# Altium footprint library Connectors.PcbLib: 92 footprints (part 5 of 6)
Each footprint in its own frame and in the unit in brackets; x right, y up, seen from the top. Pads: shape width x height; smd on the part's side, far side on the other; paste and mask are expansions set on the pad; w line width, h text height; cw(c..) or ccw(c..) is an arc to the next point about the centre after c.
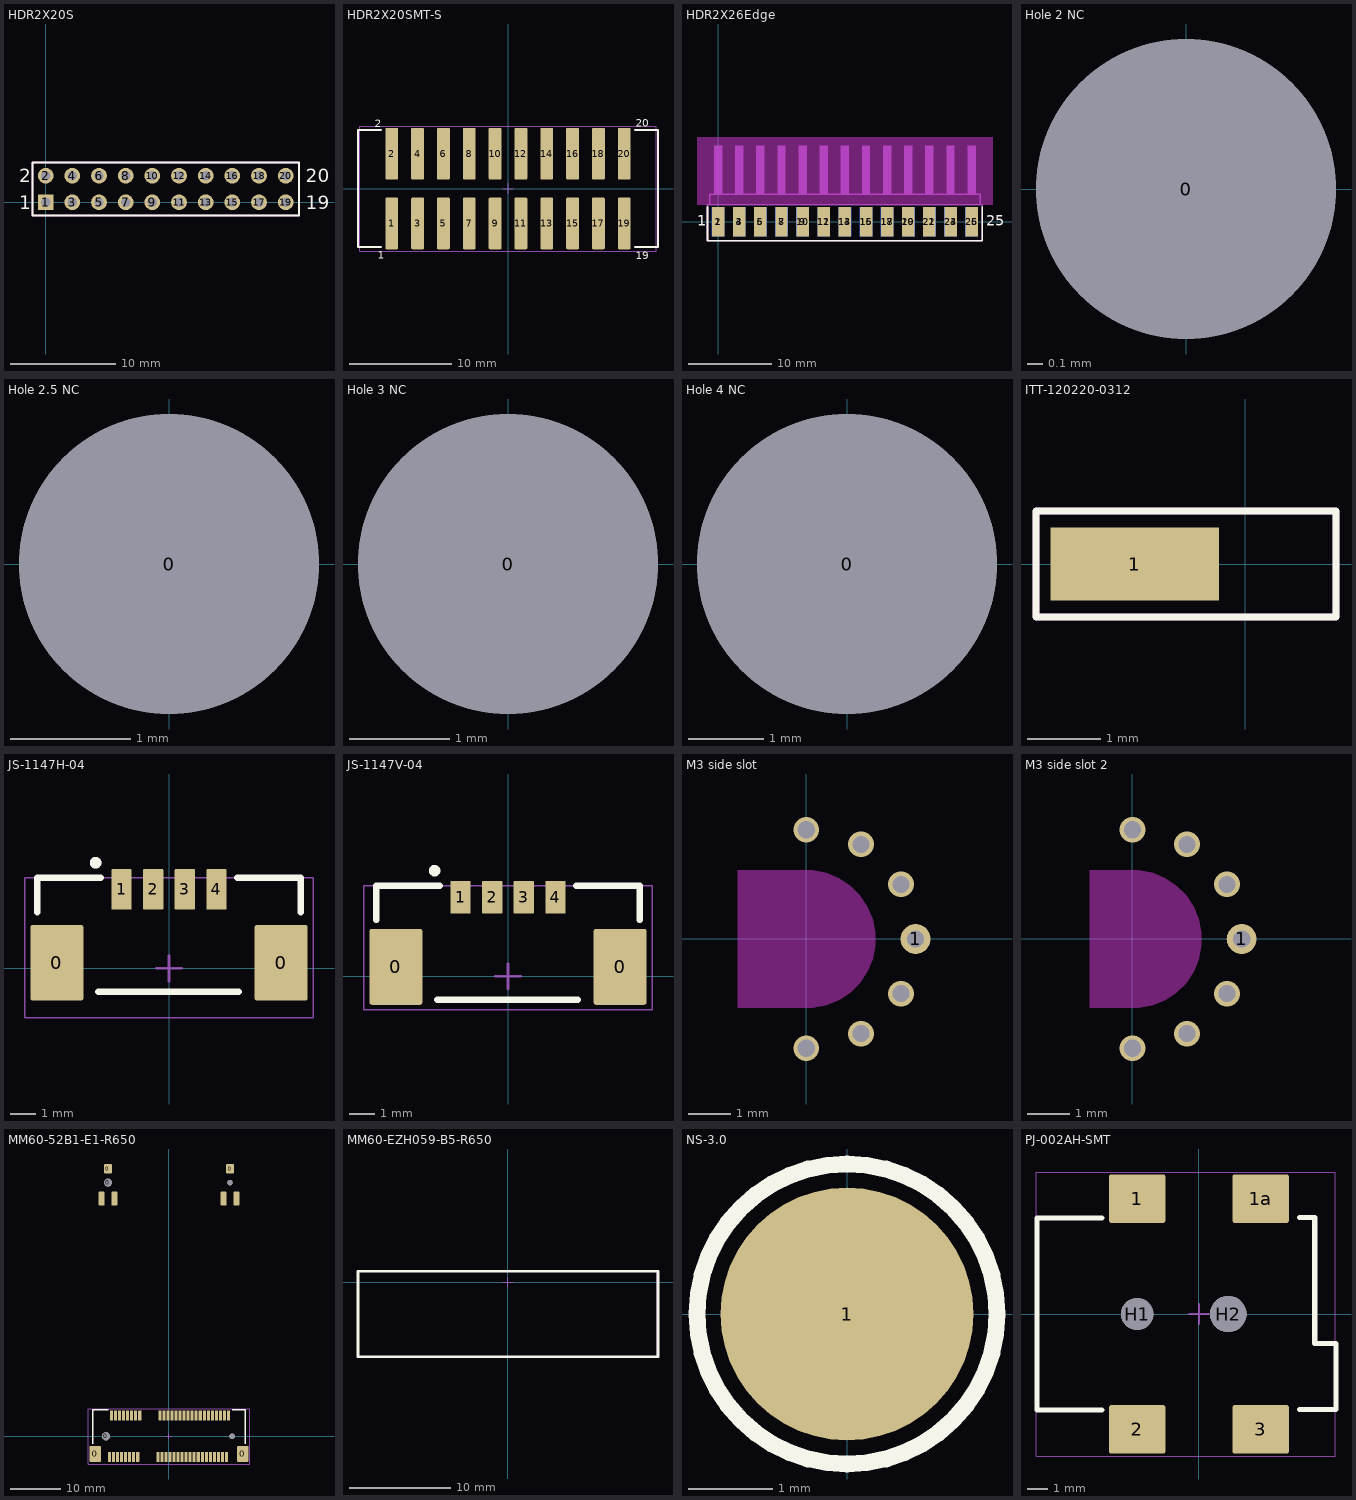
[diagram p4: the footprints below, top view; thin cyan lines are the x and y axes]

## HDR2X20S [mm] "Connector; Header; 10x2 Position"
pads (20):
  rect 1.5x1.5 hole 0.9: 1(0,0)
  round 1.5 hole 0.9: 2(0,2.54) 3(2.54,0) 4(2.54,2.54) 5(5.08,0) 6(5.08,2.54) 7(7.62,0) 8(7.62,2.54) 9(10.16,0) 10(10.16,2.54) 11(12.7,0) 12(12.7,2.54) 13(15.24,0) 14(15.24,2.54) 15(17.78,0) 16(17.78,2.54) 17(20.32,0) 18(20.32,2.54) 19(22.86,0) 20(22.86,2.54)
Top Overlay:
  lines w0.2: -1.27,-1.27 -1.27,3.81 24.13,3.81 24.13,-1.27 -1.27,-1.27
  text "2" at -2.54,1.905 h1.27
  text "1" at -2.54,-0.635 h1.27
  text "20" at 24.765,1.905 h1.27
  text "19" at 24.765,-0.635 h1.27
Mechanical 13:
  lines w0.2: -1.27,-1.27 24.13,-1.27 24.13,3.81 -1.27,3.81 -1.27,-1.27
  text ".Comment" at -0.975,-2.025 h0.51
  text ".Designator" at -1.125,4.19 h0.51

## HDR2X20SMT-S [mil] "Connector; Header; 10x2 Position, Shrouded SMT"
height 400
pads (20):
  rrect20% 50x200 smd: 1(-450,-135) 2(-450,135) 3(-350,-135) 4(-350,135) 5(-250,-135) 6(-250,135) 7(-150,-135) 8(-150,135) 9(-50,-135) 10(-50,135) 11(50,-135) 12(50,135) 13(150,-135) 14(150,135) 15(250,-135) 16(250,135) 17(350,-135) 18(350,135) 19(450,-135) 20(450,135)
Top Overlay:
  lines w7.87: -492.13,-226.38 -580.71,-226.38 -580.71,226.38 -492.13,226.38 ; 492.13,-226.38 580.71,-226.38 580.71,226.38 492.13,226.38
  text "2" at -515.75,238.19 h30
  text "1" at -503.94,-271.65 h30
  text "20" at 494.09,240.16 h30
  text "19" at 494.09,-273.62 h30
Mechanical 13:
  lines w3.94: -492.13,-226.38 -580.71,-226.38 -580.71,226.38 -492.13,226.38 ; 492.13,-226.38 580.71,-226.38 580.71,226.38 492.13,226.38
  text ".Comment" at -78.74,-23.62 h20
  text ".Designator" at -98.43,5.91 h20
Mechanical 15:
  lines w1.97: -574.8,-242.13 -574.8,242.13 574.8,242.13 574.8,-242.13 -574.8,-242.13
  lines w3.94: -19.68,0 19.68,0 ; 0,-19.69 0,19.68
3D body "Samtec-HTSS-110-01-G-DV.STEP": height 400, standoff 0, extent -574.99,-220 575,220

## HDR2X26Edge [mm] "Connector; Header; 13x2 Position, edge"
pads (26):
  rect 1.5x3.5 smd paste-3: 1(0,0) 3(2.54,0) 5(5.08,0) 7(7.62,0) 9(10.16,0) 11(12.7,0) 13(15.24,0) 15(17.78,0) 17(20.32,0) 19(22.86,0) 21(25.4,0) 23(27.94,0) 25(30.48,0)
  rect 1.5x3.5 smd far side paste-3: 2(0,0) 4(2.54,0) 6(5.08,0) 8(7.62,0) 10(10.16,0) 12(12.7,0) 14(15.24,0) 16(17.78,0) 18(20.32,0) 20(22.86,0) 22(25.4,0) 24(27.94,0) 26(30.48,0)
Top Overlay:
  lines w0.2: -1.27,1.778 -1.27,-2.286 31.75,-2.286 31.75,1.778
  text "1" at -2.54,-0.508 h1.27
  text "25" at 32.258,-0.508 h1.27
Bottom Overlay:
  lines w0.2: -1.27,1.778 -1.27,-2.286 31.75,-2.286 31.75,1.778
  text "2" at -2.286,-0.508 h1.27
  text "20" at 34.544,-0.508 h1.27
Keep-Out Layer:
  board cut-out: 33.02,2.032 33.02,10.16 -2.54,10.16 -2.54,2.032
Mechanical 13:
  rectangle: 29.972,3.302 30.988,9.144
  rectangle: 27.432,3.302 28.448,9.144
  rectangle: 24.892,3.302 25.908,9.144
  rectangle: -0.508,3.302 0.508,9.144
  rectangle: 2.032,3.302 3.048,9.144
  rectangle: 4.572,3.302 5.588,9.144
  rectangle: 7.112,3.302 8.128,9.144
  rectangle: 9.652,3.302 10.668,9.144
  rectangle: 12.192,3.302 13.208,9.144
  rectangle: 14.732,3.302 15.748,9.144
  rectangle: 17.272,3.302 18.288,9.144
  rectangle: 19.812,3.302 20.828,9.144
  rectangle: 22.352,3.302 23.368,9.144
  lines w0.152: -1.016,2.032 -1.016,3.302 23.876,3.302 31.496,3.302 31.496,2.032
  lines w0.2: -1.27,-2.286 31.75,-2.286 31.75,2.032 -1.27,2.032 -1.27,-2.286
  text ".Comment" at -1.27,-3.048 h0.51
  text ".Designator" at -1.27,-3.81 h0.51
Mechanical 14:
  rectangle: 29.972,3.302 30.988,9.144
  rectangle: 27.432,3.302 28.448,9.144
  rectangle: 24.892,3.302 25.908,9.144
  rectangle: 22.352,3.302 23.368,9.144
  rectangle: 19.812,3.302 20.828,9.144
  rectangle: 17.272,3.302 18.288,9.144
  rectangle: 14.732,3.302 15.748,9.144
  rectangle: 12.192,3.302 13.208,9.144
  rectangle: 9.652,3.302 10.668,9.144
  rectangle: 7.112,3.302 8.128,9.144
  rectangle: 4.572,3.302 5.588,9.144
  rectangle: 2.032,3.302 3.048,9.144
  rectangle: -0.508,3.302 0.508,9.144
  lines w0.152: -1.016,2.032 -1.016,3.302 31.496,3.302 31.496,2.032
  lines w0.2: -1.27,-2.286 -1.27,2.032 31.75,2.032 31.75,-2.286 -1.27,-2.286
  text ".Designator" at -1.27,-3.81 h0.51
  text ".Comment" at -1.27,-3.048 h0.51
3D body "pin_header_awl254-dg-g26d.stp": height 1.59, standoff -3.49, extent -1.27,-1.476 31.75,10.024

## Hole 2 NC [mm]
pads (1):
  round 2 hole 2 unplated: 0(0,0)

## Hole 2.5 NC [mm]
pads (1):
  round 2.5 hole 2.5 unplated: 0(0,0)

## Hole 3 NC [mm]
pads (1):
  round 3 hole 3 unplated: 0(0,0)

## Hole 4 NC [mm]
pads (1):
  round 4 hole 4 unplated: 0(0,0)

## ITT-120220-0312 [mm] "Universal Contact SMD 2.5mm"
height 2.5
pads (1):
  rect 2.3x1 smd: 1(-1.51,0)
Top Overlay:
  lines w0.1: -2.86,-0.725 1.24,-0.725 1.24,0.725 -2.86,0.725 -2.86,-0.725
Mechanical 13:
  lines w0.1: -2.86,-0.725 -2.86,0.725 1.24,0.725 1.24,-0.725 -2.86,-0.725
  text ".Designator" at -2.71,1.525 h0.51
  text ".Comment" at -2.685,0.825 h0.51
Mechanical 15:
  lines w0.1: -2.86,-0.725 -2.86,0.725 1.24,0.725 1.24,-0.725 -2.86,-0.725

## JS-1147H-04 [mm]
height 3.4
pads (6):
  rrect10% 2.1x3 smd: 0(-4.425,0.225) 0(4.425,0.225)
  rrect10% 0.8x1.6 smd: 1(-1.875,3.125) 2(-0.625,3.125) 3(0.625,3.125) 4(1.875,3.125)
Top Overlay:
  circle w0.254: c-2.9,4.175 r0.1
  lines w0.254: -5.2,2.225 -5.2,3.575 -2.7,3.575 ; -2.8,-0.925 2.75,-0.925 ; 2.7,3.575 5.2,3.575 5.2,2.225
Mechanical 13:
  circle w0.254: c-2.9,4.175 r0.1
  lines w0.1: -5.2,2.225 -5.2,3.575 -2.7,3.575 ; -2.8,-0.925 2.75,-0.925 ; 2.7,3.575 5.2,3.575 5.2,2.225
  text ".Comment" at -2.3,-0.175 h0.51
  text ".Designator" at -2.325,0.525 h0.51
Mechanical 15:
  lines w0.05: -5.7,-1.95 5.7,-1.95 5.7,3.575 -5.7,3.575 -5.7,-1.95
  lines w0.1: -0.5,0 0.5,0 ; 0,-0.5 0,0.5
3D body "532610471.stp": height 3.43, standoff 0.03, extent -5.075,-1.875 5.075,3.325

## JS-1147V-04 [mm]
height 5.8
pads (6):
  rrect10% 2.1x3 smd: 0(-4.425,0.375) 0(4.425,0.375)
  rrect10% 0.8x1.3 smd: 1(-1.875,3.125) 2(-0.625,3.125) 3(0.625,3.125) 4(1.875,3.125)
Top Overlay:
  circle w0.254: c-2.9,4.175 r0.1
  lines w0.254: -5.2,2.225 -5.2,3.575 -2.7,3.575 ; -2.8,-0.925 2.75,-0.925 ; 2.7,3.575 5.2,3.575 5.2,2.225
Mechanical 13:
  lines w0.1: -5.2,2.225 -5.2,3.575 -2.7,3.575 ; -2.8,-0.925 2.75,-0.925 ; 2.7,3.575 5.2,3.575 5.2,2.225
  text ".Comment" at -2.3,-0.175 h0.51
  text ".Designator" at -2.325,0.525 h0.51
Mechanical 15:
  lines w0.05: -5.7,-1.325 5.7,-1.325 5.7,3.575 -5.7,3.575 -5.7,-1.325
  lines w0.1: -0.5,0 0.5,0 ; 0,-0.5 0,0.5
3D body "533980471a.stp": height 4.7, standoff 0, extent -5.05,-0.725 5.1,3.475

## M3 side slot [mm] "Slot for M3 screw"
pads (1):
  round 0.7 smd paste-5: 1(2.55,0)
via 2.55,0 diameter 0.6 hole 0.4
via 2.208,1.275 diameter 0.6 hole 0.4
via 1.275,2.208 diameter 0.6 hole 0.4
via 0,2.55 diameter 0.6 hole 0.4
via 0,-2.55 diameter 0.6 hole 0.4
via 1.275,-2.208 diameter 0.6 hole 0.4
via 2.208,-1.275 diameter 0.6 hole 0.4
Keep-Out Layer:
  board cut-out: -1.6,1.6 0,1.6 0.158,1.601 0.47,1.54 0.763,1.42 1.027,1.245 1.251,1.021 1.428,0.758 1.55,0.465 1.612,0.155 1.612,-0.162 1.55,-0.473 1.428,-0.766 1.251,-1.029 1.027,-1.252 0.763,-1.428 0.47,-1.548 0.158,-1.609 0,-1.608 -1.6,-1.6
Multi-Layer:
  region: 0,1.6 -1.6,1.6 -1.6,3.5 0,3.5 0.275,3.5 0.82,3.414 1.344,3.244 1.834,2.993 2.28,2.67 2.67,2.28 2.993,1.834 3.244,1.344 3.414,0.82 3.5,0.275 3.5,-0.275 3.414,-0.82 3.244,-1.344 2.993,-1.834 2.67,-2.28 2.28,-2.67 1.834,-2.993 1.344,-3.244 0.82,-3.414 0.275,-3.5 0,-3.5 -1.6,-3.5 -1.6,-1.6 0,-1.6 0.157,-1.592 0.464,-1.531 0.754,-1.411 1.015,-1.237 1.237,-1.015 1.411,-0.754 1.531,-0.464 1.592,-0.157 1.592,0.157 1.531,0.464 1.411,0.754 1.237,1.015 1.015,1.237 0.754,1.411 0.464,1.531 0.157,1.592

## M3 side slot 2 [mm] "Slot for M3 screw 1mm"
pads (1):
  round 0.7 smd paste-5: 1(2.55,0)
via 2.208,-1.275 diameter 0.6 hole 0.4
via 1.275,-2.208 diameter 0.6 hole 0.4
via 0,-2.55 diameter 0.6 hole 0.4
via 0,2.55 diameter 0.6 hole 0.4
via 1.275,2.208 diameter 0.6 hole 0.4
via 2.208,1.275 diameter 0.6 hole 0.4
via 2.55,0 diameter 0.6 hole 0.4
Keep-Out Layer:
  board cut-out: -1,1.6 0,1.6 0.158,1.601 0.47,1.54 0.763,1.42 1.027,1.245 1.251,1.021 1.428,0.758 1.55,0.465 1.612,0.155 1.612,-0.162 1.55,-0.473 1.428,-0.766 1.251,-1.029 1.027,-1.252 0.763,-1.428 0.47,-1.548 0.158,-1.609 0,-1.608 -1,-1.603
Multi-Layer:
  region: 0,1.6 -1,1.6 -1,3.5 0,3.5 0.275,3.5 0.82,3.414 1.344,3.244 1.834,2.993 2.28,2.67 2.67,2.28 2.993,1.834 3.244,1.344 3.414,0.82 3.5,0.275 3.5,-0.275 3.414,-0.82 3.244,-1.344 2.993,-1.834 2.67,-2.28 2.28,-2.67 1.834,-2.993 1.344,-3.244 0.82,-3.414 0.275,-3.5 0,-3.5 -1,-3.5 -1,-1.6 0,-1.6 0.157,-1.592 0.464,-1.531 0.754,-1.411 1.015,-1.237 1.237,-1.015 1.411,-0.754 1.531,-0.464 1.592,-0.157 1.592,0.157 1.531,0.464 1.411,0.754 1.237,1.015 1.015,1.237 0.754,1.411 0.464,1.531 0.157,1.592

## MM60-52B1-E1-R650 [mm]
height 5.9
pads (64):
  rrect20% 2.3x3.2 smd: 0(-14.65,-3.5) 0(14.65,-3.5)
  rrect20% 1.2x2.7 smd: 0(-13.35,47.15) 0(-10.85,47.15) 0(10.85,47.15) 0(13.35,47.15)
  round 1.6 hole 1.6 unplated: 0(-12.5,0)
  round 1.55 hole 1.55 unplated: 0(-12.1,50.3)
  rrect20% 1.5x1.9 smd: 0(-12.1,53.05) 0(12.1,53.05)
  round 1.05 hole 1.05 unplated: 0(12.1,50.3)
  round 1.1 hole 1.1 unplated: 0(12.5,0)
  rrect20% 0.6x2 smd: 1(-11.8,-4.1) 2(-11.4,4.1) 3(-11,-4.1) 4(-10.6,4.1) 5(-10.2,-4.1) 6(-9.8,4.1) 7(-9.4,-4.1) 8(-9,4.1) 9(-8.6,-4.1) 10(-8.2,4.1) 11(-7.8,-4.1) 12(-7.4,4.1) 13(-7,-4.1) 14(-6.6,4.1) 15(-6.2,-4.1) 16(-5.8,4.1) 17(-2.2,-4.1) 18(-1.8,4.1) 19(-1.4,-4.1) 20(-1,4.1) 21(-0.6,-4.1) 22(-0.2,4.1) 23(0.2,-4.1) 24(0.6,4.1) 25(1,-4.1) 26(1.4,4.1) 27(1.8,-4.1) 28(2.2,4.1) 29(2.6,-4.1) 30(3,4.1) 31(3.4,-4.1) 32(3.8,4.1) 33(4.2,-4.1) 34(4.6,4.1) 35(5,-4.1) 36(5.4,4.1) 37(5.8,-4.1) 38(6.2,4.1) 39(6.6,-4.1) 40(7,4.1) 41(7.4,-4.1) 42(7.8,4.1) 43(8.2,-4.1) 44(8.6,4.1) 45(9,-4.1) 46(9.4,4.1) 47(9.8,-4.1) 48(10.2,4.1) 49(10.6,-4.1) 50(11,4.1) 51(11.4,-4.1) 52(11.8,4.1)
Top Overlay:
  lines w0.254: -15.1,-1.5 -15.1,5.25 -12,5.25 ; 12.5,5.25 15.1,5.25 15.1,-1.5
Mechanical 13:
  lines w0.05: -16,-5.5 16,-5.5 16,5.5 -16,5.5 -16,-5.5
  text ".Designator" at -13,5.8 h0.51
  text ".Comment" at -3.25,5.8 h0.51
Mechanical 15:
  lines w0.05: -16,-5.5 -16,5.5 16,5.5 16,-5.5 -16,-5.5
  lines w0.1: -0.5,0 0.5,0 ; 0,-0.5 0,0.5
3D body "MM60-52B1-E1-R2.step": height 5.9, standoff -0.8, extent -14.85,-5 14.85,5

## MM60-EZH059-B5-R650 [mm]
height 5.9
Top Overlay:
  lines w0.254: -14.8,-7.35 0,-7.35 14.8,-7.35 ; -14.8,-7.3 -14.8,1.05 0,1.05 14.8,1.05 14.8,-7.3
Mechanical 13:
  lines w0.05: -14.75,-7.3 -14.75,1.05 14.75,1.05 14.75,-7.3 -14.75,-7.3
  text ".Comment" at -4.05,1.6 h0.51
  text ".Designator" at -13.8,1.6 h0.51
Mechanical 15:
  lines w0.05: -14.75,-7.3 14.75,-7.3 14.75,1.05 -14.75,1.05 -14.75,-7.3
  lines w0.1: -0.5,0 0.5,0 ; 0,-0.5 0,0.5
3D body "MM60-EZH059-B5-R2.step": height 6.8, standoff -0.8, extent -14.5,-7.1 14.5,0.8

## NS-3.0 [mm] "SMT Base 3mm height"
height 3
pads (1):
  round 3 smd: 1(0,0)
Top Overlay:
  circle w0.2: c0,0 r1.778
Mechanical 13:
  text ".Comment" at -1.875,1.866 h0.51
  text ".Designator" at -1.9,2.566 h0.51
Mechanical 15:
  circle w0.1: c0,0 r1.778
3D body: height 3, standoff 0, extent -1.25,-1.25 1.25,1.25

## PJ-002AH-SMT [mm]
height 11
pads (6):
  rrect10% 2.8x2.4 smd: 1(-3.05,5.7) 1a(3.05,5.7) 2(-3.05,-5.7) 3(3.05,-5.7)
  round 1.6 hole 1.6 unplated: H1(-3.05,0)
  round 1.8 hole 1.8 unplated: H2(1.45,0)
Top Overlay:
  lines w0.254: -4.8,-4.75 -8,-4.75 -8,4.75 -4.8,4.75 ; 4.975,-4.725 6.775,-4.725 6.775,-1.45 5.725,-1.45 5.725,4.775 4.975,4.775
Mechanical 13:
  lines w0.1: -4.8,-4.75 -8,-4.75 -8,4.75 -4.8,4.75 ; 4.95,-4.75 6.75,-4.75 6.75,-1.475 5.7,-1.475 5.7,4.75 4.95,4.75
  text ".Comment" at -1.875,7.2 h0.51
  text ".Designator" at -1.9,7.9 h0.51
Mechanical 15:
  lines w0.05: -8.05,-7.025 -8.05,7 6.75,7 6.75,-7.025 -8.05,-7.025
  lines w0.1: -0.5,0 0.5,0 ; 0,-0.5 0,0.5
3D body "pj-002ah-smt-1.stp": height 11.2, standoff -1, extent -8.05,-6.3 6.75,6.3